# Altium footprint library MEBot.PcbLib: 161 footprints (part 9 of 11)
Each footprint in its own frame and in the unit in brackets; x right, y up, seen from the top. Pads: shape width x height; smd on the part's side, far side on the other; paste and mask are expansions set on the pad; w line width, h text height; cw(c..) or ccw(c..) is an arc to the next point about the centre after c.
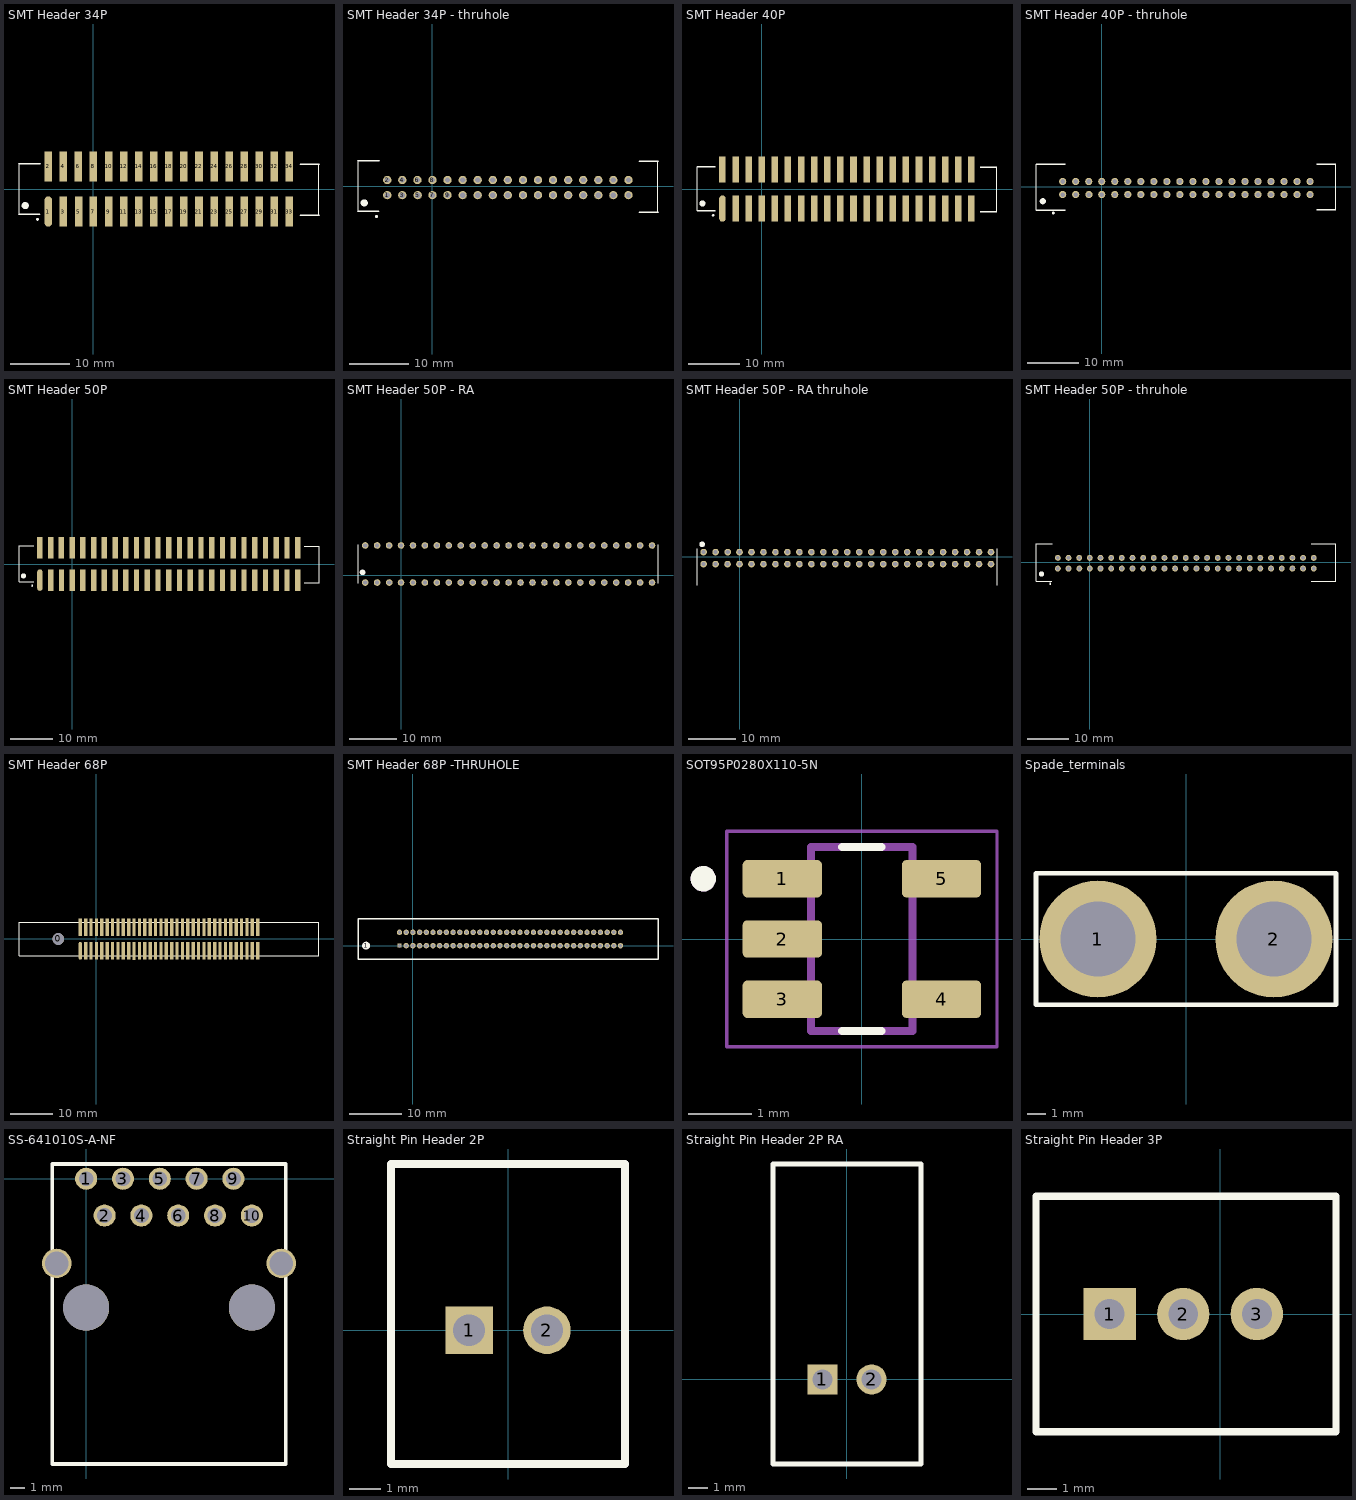
[diagram p8: the footprints below, top view; thin cyan lines are the x and y axes]

## SMT Header 34P [mm] "Box Header, SMT 34 Leads; Row Spacing 6.86 mm; Pitch 2.54 mm"
height 10
pads (34):
  rrect100% 1.27x5.08 smd: 1(-7.62,-3.8)
  rect 1.27x5.08 smd: 2(-7.62,3.8) 3(-5.08,-3.8) 4(-5.08,3.8) 5(-2.5,-3.8) 6(-2.54,3.8) 7(0,-3.8) 8(0,3.8) 9(2.54,-3.8) 10(2.54,3.8) 11(5.08,-3.8) 12(5.08,3.8) 13(7.62,-3.8) 14(7.62,3.8) 15(10.16,-3.8) 16(10.16,3.8) 17(12.7,-3.8) 18(12.7,3.8) 19(15.24,-3.8) 20(15.24,3.8) 21(17.78,-3.8) 22(17.78,3.8) 23(20.32,-3.8) 24(20.32,3.8) 25(22.86,-3.8) 26(22.86,3.8) 27(25.4,-3.8) 28(25.4,3.8) 29(27.94,-3.8) 30(27.94,3.8) 31(30.48,-3.8) 32(30.48,3.8) 33(33.02,-3.8) 34(33.02,3.8)
Top Overlay:
  circle w0.25: c-9.425,-5.1 r0.125
  circle w0.6: c-11.5,-2.8 r0.3
  lines w0.2: -12.55,-4.25 -12.55,4.295 ; 37.95,-4.295 37.95,4.23
  lines w0.254: -12.55,-4.25 -9.05,-4.25 ; -12.55,4.295 -9.005,4.295 ; 34.8,-4.4 38,-4.4 ; 34.8,4.2 38,4.2
3D body "HEADER34P-SMD.stp": height 10.16, standoff 0, extent -12.522,-5.74 37.973,5.436

## SMT Header 34P - thruhole [mil] "Box Header, SMT 34 Leads; Row Spacing 6.86 mm; Pitch 2.54 mm"
height 393.7
pads (34):
  round 55 hole 35: 1(-300,-58.86) 2(-300,41.14) 3(-200,-58.86) 4(-200,41.14) 5(-98.43,-58.86) 6(-100,41.14) 7(0,-58.86) 8(0,41.14) 9(100,-58.86) 10(100,41.14) 11(200,-58.86) 12(200,41.14) 13(300,-58.86) 14(300,41.14) 15(400,-58.86) 16(400,41.14) 17(500,-58.86) 18(500,41.14) 19(600,-58.86) 20(600,41.14) 21(700,-58.86) 22(700,41.14) 23(800,-58.86) 24(800,41.14) 25(900,-58.86) 26(900,41.14) 27(1000,-58.86) 28(1000,41.14) 29(1100,-58.86) 30(1100,41.14) 31(1200,-58.86) 32(1200,41.14) 33(1300,-58.86) 34(1300,41.14)
Top Overlay:
  circle w23.62: c-452.76,-110.24 r11.81
  circle w9.84: c-371.06,-200.79 r4.92
  lines w7.87: -494.09,-167.32 -494.09,169.09 ; 1494.09,-169.09 1494.09,166.54
  lines w10: -494.09,-167.32 -356.3,-167.32 ; -494.09,169.09 -354.53,169.09 ; 1370.08,-173.23 1496.06,-173.23 ; 1370.08,165.35 1496.06,165.35
3D body "HEADER34P-THRU.stp": height 370, standoff -112, extent -494,-186 1494,154

## SMT Header 40P [mm] "Box Header, SMT 40 Leads; Row Spacing 6.86 mm; Pitch 2.54 mm"
height 10
pads (40):
  rrect100% 1.27x5.08 smd: 1(-7.62,-3.8)
  rect 1.27x5.08 smd: 2(-7.62,3.8) 3(-5.08,-3.8) 4(-5.08,3.8) 5(-2.5,-3.8) 6(-2.54,3.8) 7(0,-3.8) 8(0,3.8) 9(2.54,-3.8) 10(2.54,3.8) 11(5.08,-3.8) 12(5.08,3.8) 13(7.62,-3.8) 14(7.62,3.8) 15(10.16,-3.8) 16(10.16,3.8) 17(12.7,-3.8) 18(12.7,3.8) 19(15.24,-3.8) 20(15.24,3.8) 21(17.78,-3.8) 22(17.78,3.8) 23(20.32,-3.8) 24(20.32,3.8) 25(22.86,-3.8) 26(22.86,3.8) 27(25.4,-3.8) 28(25.4,3.8) 29(27.94,-3.8) 30(27.94,3.8) 31(30.48,-3.8) 32(30.48,3.8) 33(33.02,-3.8) 34(33.02,3.8) 35(35.56,-3.8) 36(35.56,3.8) 37(38.1,-3.8) 38(38.1,3.8) 39(40.64,-3.8) 40(40.64,3.8)
Top Overlay:
  circle w0.25: c-9.425,-5.1 r0.125
  circle w0.6: c-11.5,-2.8 r0.3
  lines w0.2: -12.55,-4.25 -12.55,4.295 ; 45.57,-4.295 45.57,4.23
  lines w0.254: -12.55,-4.25 -9.05,-4.25 ; -12.55,4.295 -9.005,4.295 ; 42.4,-4.4 45.6,-4.4 ; 42.4,4.2 45.6,4.2
3D body "n2540-6v0crb.stp": height 10.16, standoff 0, extent -12.395,-5.334 45.72,5.842

## SMT Header 40P - thruhole [mil] "Box Header, 400 Leads; Row Spacing 6.86 mm; Pitch 2.54 mm"
height 393.7
pads (40):
  round 55 hole 35: 1(-300,-58.86) 2(-300,41.14) 3(-200,-58.86) 4(-200,41.14) 5(-98.43,-58.86) 6(-100,41.14) 7(0,-58.86) 8(0,41.14) 9(100,-58.86) 10(100,41.14) 11(200,-58.86) 12(200,41.14) 13(300,-58.86) 14(300,41.14) 15(400,-58.86) 16(400,41.14) 17(500,-58.86) 18(500,41.14) 19(600,-58.86) 20(600,41.14) 21(700,-58.86) 22(700,41.14) 23(800,-58.86) 24(800,41.14) 25(900,-58.86) 26(900,41.14) 27(1000,-58.86) 28(1000,41.14) 29(1100,-58.86) 30(1100,41.14) 31(1200,-58.86) 32(1200,41.14) 33(1300,-58.86) 34(1300,41.14) 35(1400,-58.86) 36(1400,41.14) 37(1500,-58.86) 38(1500,41.14) 39(1600,-58.86) 40(1600,41.14)
Top Overlay:
  circle w9.84: c-371.06,-200.79 r4.92
  circle w23.62: c-452.76,-110.24 r11.81
  lines w7.87: -505,-178 -505,173 ; 1799,-177 1799,173
  lines w10: -505,-178 -282,-178 ; -505,173 -282,173 ; 1652,-177 1799,-177 ; 1652,173 1799,173
3D body "header40P-THRU.stp": height 370, standoff -112, extent -495,-187 1793,153

## SMT Header 50P [mm] "Box Header, SMT 50 Leads; Row Spacing 6.86 mm; Pitch 2.54 mm"
height 10
pads (50):
  rrect100% 1.27x5.08 smd: 1(-7.62,-3.8)
  rect 1.27x5.08 smd: 2(-7.62,3.8) 3(-5.08,-3.8) 4(-5.08,3.8) 5(-2.5,-3.8) 6(-2.54,3.8) 7(0,-3.8) 8(0,3.8) 9(2.54,-3.8) 10(2.54,3.8) 11(5.08,-3.8) 12(5.08,3.8) 13(7.62,-3.8) 14(7.62,3.8) 15(10.16,-3.8) 16(10.16,3.8) 17(12.7,-3.8) 18(12.7,3.8) 19(15.24,-3.8) 20(15.24,3.8) 21(17.78,-3.8) 22(17.78,3.8) 23(20.32,-3.8) 24(20.32,3.8) 25(22.86,-3.8) 26(22.86,3.8) 27(25.4,-3.8) 28(25.4,3.8) 29(27.94,-3.8) 30(27.94,3.8) 31(30.48,-3.8) 32(30.48,3.8) 33(33.02,-3.8) 34(33.02,3.8) 35(35.56,-3.8) 36(35.56,3.8) 37(38.1,-3.8) 38(38.1,3.8) 39(40.64,-3.8) 40(40.64,3.8) 41(43.18,-3.8) 42(43.18,3.8) 43(45.72,-3.8) 44(45.72,3.8) 45(48.26,-3.8) 46(48.26,3.8) 47(50.8,-3.8) 48(50.8,3.8) 49(53.34,-3.8) 50(53.34,3.8)
Top Overlay:
  circle w0.25: c-9.425,-5.1 r0.125
  circle w0.6: c-11.5,-2.8 r0.3
  lines w0.2: -12.55,-4.25 -12.55,4.295 ; 54.915,-4.4 58.369,-4.4 58.369,4.2 54.94,4.2
  lines w0.254: -12.55,-4.25 -9.05,-4.25 ; -12.55,4.295 -9.005,4.295
3D body "HEADER50P-SMD.stp": height 10.16, standoff 0, extent -12.497,-5.461 58.318,5.715

## SMT Header 50P - RA [mil] "Box Header, SMT 50 Leads; Row Spacing 6.86 mm; Pitch 2.54 mm"
height 393.7
pads (50):
  round 55 hole 35: 1(-300,-60) 2(-300,250) 3(-200,-60) 4(-200,250) 5(-98.43,-60) 6(-100,250) 7(0,-60) 8(0,250) 9(100,-60) 10(100,250) 11(200,-60) 12(200,250) 13(300,-60) 14(300,250) 15(400,-60) 16(400,250) 17(500,-60) 18(500,250) 19(600,-60) 20(600,250) 21(700,-60) 22(700,250) 23(800,-60) 24(800,250) 25(900,-60) 26(900,250) 27(1000,-60) 28(1000,250) 29(1100,-60) 30(1100,250) 31(1200,-60) 32(1200,250) 33(1300,-60) 34(1300,250) 35(1400,-60) 36(1400,250) 37(1500,-60) 38(1500,250) 39(1599.21,-60) 40(1599.21,250) 41(1700,-60) 42(1700,250) 43(1800,-60) 44(1800,250) 45(1900,-60) 46(1900,250) 47(2000,-60) 48(2000,250) 49(2100,-60) 50(2100,250)
Top Overlay:
  circle w23.62: c-321.81,25 r11.81
  lines w10: -360,-65 -360,255 ; 2150,-65 2150,255
3D body "c-535512-7-y1-3d.stp": height 249.65, standoff -104, extent -355,-65 2145,255

## SMT Header 50P - RA thruhole [mil] "Box Header, SMT 50 Leads; Row Spacing 6.86 mm; Pitch 2.54 mm"
height 393.7
pads (50):
  round 55 hole 35: 1(-300,40) 2(-300,-60) 3(-200,40) 4(-200,-60) 5(-98.43,40) 6(-100,-60) 7(0,40) 8(0,-60) 9(100,40) 10(100,-60) 11(200,40) 12(200,-60) 13(300,40) 14(300,-60) 15(400,40) 16(400,-60) 17(500,40) 18(500,-60) 19(600,40) 20(600,-60) 21(700,40) 22(700,-60) 23(800,40) 24(800,-60) 25(900,40) 26(900,-60) 27(1000,40) 28(1000,-60) 29(1100,40) 30(1100,-60) 31(1200,40) 32(1200,-60) 33(1300,40) 34(1300,-60) 35(1400,40) 36(1400,-60) 37(1500,40) 38(1500,-60) 39(1599.21,40) 40(1599.21,-60) 41(1700,40) 42(1700,-60) 43(1800,40) 44(1800,-60) 45(1900,40) 46(1900,-60) 47(2000,40) 48(2000,-60) 49(2100,40) 50(2100,-60)
Top Overlay:
  circle w23.62: c-311.81,105 r11.81
  lines w10: -355,-235 -355,70 ; 2150,-235 2150,70
3D body "c-2-86479-9-s-3d.stp": height 89, standoff -259, extent -342,-535 2142,72

## SMT Header 50P - thruhole [mil] "Box Header, SMT 50 Leads; Row Spacing 6.86 mm; Pitch 2.54 mm"
height 393.7
pads (50):
  round 55 hole 35: 1(-300,-58.86) 2(-300,41.14) 3(-200,-58.86) 4(-200,41.14) 5(-98.43,-58.86) 6(-100,41.14) 7(0,-58.86) 8(0,41.14) 9(100,-58.86) 10(100,41.14) 11(200,-58.86) 12(200,41.14) 13(300,-58.86) 14(300,41.14) 15(400,-58.86) 16(400,41.14) 17(500,-58.86) 18(500,41.14) 19(600,-58.86) 20(600,41.14) 21(700,-58.86) 22(700,41.14) 23(800,-58.86) 24(800,41.14) 25(900,-58.86) 26(900,41.14) 27(1000,-58.86) 28(1000,41.14) 29(1100,-58.86) 30(1100,41.14) 31(1200,-58.86) 32(1200,41.14) 33(1300,-58.86) 34(1300,41.14) 35(1400,-58.86) 36(1400,41.14) 37(1500,-58.86) 38(1500,41.14) 39(1599.21,-58.86) 40(1599.21,41.14) 41(1700,-58.86) 42(1700,41.14) 43(1800,-58.86) 44(1800,41.14) 45(1900,-58.86) 46(1900,41.14) 47(2000,-58.86) 48(2000,41.14) 49(2100,-58.86) 50(2100,41.14)
Top Overlay:
  circle w9.84: c-371.06,-200.79 r4.92
  circle w23.62: c-452.76,-110.24 r11.81
  lines w7.87: -505,-178 -505,173 ; 2309,-177 2309,173
  lines w10: -505,-178 -356.3,-178 ; -505,173 -354.53,173 ; 2077,-177 2309,-177 ; 2077,173 2309,173
3D body "HEADER50P-THRU.stp": height 370, standoff -112, extent -494,-187 2294,153

## SMT Header 68P [mm] "Box Header, SMT 68 Leads; Row Spacing 5.59 mm; Pitch 1.27 mm"
height 15.5
pads (69):
  round 2.77 hole 2.77: 0(-9.02,0)
  rrect100% 0.75x4.2 smd: 1(-3.81,-2.795)
  rect 0.75x4.2 smd: 2(-3.81,2.795) 3(-2.54,-2.795) 4(-2.54,2.795) 5(-1.27,-2.795) 6(-1.27,2.795) 7(0,-2.795) 8(0,2.795) 9(1.27,-2.795) 10(1.27,2.795) 11(2.54,-2.795) 12(2.54,2.795) 13(3.81,-2.795) 14(3.81,2.795) 15(5.08,-2.795) 16(5.08,2.795) 17(6.35,-2.795) 18(6.35,2.795) 19(7.62,-2.795) 20(7.62,2.795) 21(8.89,-2.805) 22(8.89,2.785) 23(10.16,-2.795) 24(10.16,2.795) 25(11.43,-2.795) 26(11.43,2.795) 27(12.7,-2.795) 28(12.7,2.795) 29(13.97,-2.795) 30(13.97,2.795) 31(15.24,-2.795) 32(15.24,2.795) 33(16.51,-2.795) 34(16.51,2.795) 35(17.78,-2.795) 36(17.78,2.795) 37(19.05,-2.795) 38(19.05,2.795) 39(20.32,-2.795) 40(20.32,2.795) 41(21.59,-2.795) 42(21.59,2.795) 43(22.86,-2.795) 44(22.86,2.795) 45(24.13,-2.795) 46(24.13,2.795) 47(25.4,-2.795) 48(25.4,2.795) 49(26.67,-2.795) 50(26.67,2.8) 51(27.94,-2.795) 52(27.94,2.795) 53(29.21,-2.795) 54(29.21,2.795) 55(30.48,-2.795) 56(30.48,2.795) 57(31.75,-2.795) 58(31.75,2.795) 59(33.02,-2.795) 60(33.02,2.795) 61(34.29,-2.795) 62(34.29,2.795) 63(35.56,-2.795) 64(35.56,2.8) 65(36.83,-2.795) 66(36.83,2.795) 67(38.1,-2.795) 68(38.1,2.795)
Top Overlay:
  lines w0.254: 52.566,4 52.578,3.988 52.578,-4 -18.288,-4 -18.288,4 52.578,4
3D body: height 15.5, standoff 0, extent -18.415,-4.127 52.705,4.127

## SMT Header 68P -THRUHOLE [mil] "Box Header, SMT 68 Leads; Row Spacing 5.59 mm; Pitch 1.27 mm"
height 610.24
pads (69):
  round 60 on Top Overlay: 1(-350,0)
  rect 30x30 hole 25: 1(-100,0)
  round 40 hole 25: 2(-100,100) 3(-50,0) 4(-50,100) 5(0,0) 6(0,100) 7(50,0) 8(50,100) 9(100,0) 10(100,100) 11(150,0) 12(150,100) 13(200,0) 14(200,100) 15(250,0) 16(250,100) 17(300,0) 18(300,100) 19(350,0) 20(350,100) 21(400,0) 22(400,100) 23(450,0) 24(450,100) 25(500,0) 26(500,100) 27(550,0) 28(550,100) 29(600,0) 30(600,100) 31(650,0) 32(650,100) 33(700,0) 34(700,100) 35(750,0) 36(750,100) 37(800,0) 38(800,100) 39(850,0) 40(850,100) 41(900,0) 42(900,100) 43(950,0) 44(950,100) 45(1000,0) 46(1000,100) 47(1050,0) 48(1050,100) 49(1100,0) 50(1100,100) 51(1150,0) 52(1150,100) 53(1200,0) 54(1200,100) 55(1250,0) 56(1250,100) 57(1300,0) 58(1300,100) 59(1350,0) 60(1350,100) 61(1400,0) 62(1400,100) 63(1450,0) 64(1450,100) 65(1500,0) 66(1500,100) 67(1550,0) 68(1550,100)
Top Overlay:
  lines w10: -410,-100 -410,200 1830,200 1830,-100 -410,-100

## SOT95P0280X110-5N [mm]
height 1.1
pads (5):
  rrect25% 1.25x0.59 smd: 1(-1.255,0.95) 2(-1.255,0) 3(-1.255,-0.95) 4(1.255,-0.95) 5(1.255,0.95)
Top Overlay:
  circle w0.2: c-2.5,0.95 r0.1
  lines w0.127: -0.31,-1.45 0.31,-1.45 ; -0.31,1.45 0.31,1.45
Mechanical 13:
  circle w0.2: c-2.5,0.95 r0.1
  lines w0.127: -0.8,-1.45 -0.8,1.45 0.8,1.45 0.8,-1.45 -0.8,-1.45
Mechanical 15:
  lines w0.05: -2.13,-1.7 2.13,-1.7 2.13,1.7 -2.13,1.7 -2.13,-1.7
3D body "step_temp.STEP": height 1.1, standoff 0, extent -1.4,-1.45 1.4,1.45

## Spade_terminals [mil] "screw holes for crimp connectors (use 4-40 screw)"
pads (2):
  round 250 hole 160: 1(-188,0) 2(187.5,0)
Top Overlay:
  lines w10: -320,-140 -320,140 320,140 320,-140 -320,-140

## SS-641010S-A-NF [mil] "CONN MOD JACK 10P10C R/A SHLD"
pads (14):
  round 60 hole 40: 1(0,0) 2(50,-100) 3(100,0) 4(150,-100) 5(200,0) 6(250,-100) 7(300,0) 8(350,-100) 9(400,0) 10(450,-100)
  round 80 hole 65: ""(-80,-230) ""(530,-230)
  round 125 hole 125: ""(0,-350) ""(450,-350)
Top Overlay:
  lines w10: -92.5,-775 542.5,-775 542.5,40 -92.5,40 -92.5,-775
3D body "ACC-M-RJE05-1AA-0X11-REVT1.STEP": height 491.34, standoff -91.34, extent -70.27,-659.32 520.28,49.34

## Straight Pin Header 2P [mil] "2.5mm pitch header for full lock & discrete wire connection"
height 433.07
pads (2):
  rect 60x60 hole 40: 1(-49.21,0)
  round 60 hole 40: 2(49.21,0)
Top Overlay:
  lines w10: -147.64,-169 147.64,-169 147.64,210 -147.64,210 -147.64,-169
3D body "DF1EC-2P-2.5DSA.stp": height 425.2, standoff -141.73, extent -150.28,-147.32 145,187.32

## Straight Pin Header 2P RA [mil] "2.5mm pitch header for full lock & discrete wire connection"
height 433.07
pads (2):
  rect 60x60 hole 40: 1(-49.21,0)
  round 60 hole 40: 2(49.21,0)
Top Overlay:
  lines w10: -147.64,-169 -147.64,430 147.64,430 147.64,-169 -147.64,-169
3D body "DF1E-2P-2.5DS.stp": height 373.62, standoff -75.2, extent -147.64,-120 147.64,423.31

## Straight Pin Header 3P [mil] "2.5mm pitch header for full lock & discrete wire connection"
height 433.07
pads (3):
  rect 70x70 hole 40: 1(-147.64,0)
  round 70 hole 40: 2(-49.21,0) 3(49.21,0)
Top Overlay:
  lines w10: -246.06,-157.48 155,-157.48 155,157.48 -246.06,157.48 -246.06,-157.48
3D body "DF1EC-3P-2.5DSA.stp": height 425.2, standoff -141.73, extent -246.85,-144.65 146.85,190